# Altium schematic symbol library MCU_Microchip_ATmega.SchLib: 440 symbols (part 6 of 9) (continued)
## ATmega3250PA-A (continued)

## ATmega3250PV-10A
designator *  value ATmega3250PV-10A
ki_keywords: AVR 8bit Microcontroller MegaAVR; ki_description: 10MHz, 32kB Flash, 2kB SRAM, 1kB EEPROM, JTAG, TQFP-100; ki_fp_filters: TQFP*14x14mm*P0.5mm*; Footprint: Package_QFP:TQFP-100_14x14mm_P0.5mm; Supplier: http://ww1.microchip.com/downloads/en/DeviceDoc/doc8023.pdf
footprint TQFP-100_14x14mm_P0.5mm
pins: 1 NC (in) hidden, 2 PE0 (io), 3 PE1 (io), 4 PE2 (io), 5 PE3 (io), 6 PE4 (io), 7 PE5 (io), 8 PE6 (io), 9 PE7 (io), 10 VCC (power), 11 GND (power), 12 NC (in) hidden, 13 PJ0 (io), 14 PJ1 (io), 15 NC (in) hidden, 16 NC (in) hidden, 17 NC (in) hidden, 18 NC (in) hidden, 19 PB0 (io), 20 PB1 (io), 21 PB2 (io), 22 PB3 (io), 23 PB4 (io), 24 PB5 (io), 25 PB6 (io), 26 PB7 (io), 27 NC (in) hidden, 28 PG3 (io), 29 PG4 (io), 30 PG5/~{{RESET}} (io), 31 VCC hidden, 32 GND hidden, 33 XTAL2 (out), 34 XTAL1 (in), 35 NC (in) hidden, 36 NC (in) hidden, 37 PJ2 (io), 38 PJ3 (io), 39 PJ4 (io), 40 PJ5 (io), 41 PJ6 (io), 42 NC (in) hidden, 43 PD0 (io), 44 PD1 (io), 45 PD2 (io), 46 PD3 (io), 47 PD4 (io), 48 PD5 (io), 49 PD6 (io), 50 PD7 (io), 51 PG0 (io), 52 PG1 (io), 53 PC0 (io), 54 PC1 (io), 55 PC2 (io), 56 PC3 (io), 57 PC4 (io), 58 PC5 (io), 59 NC (in) hidden, 60 NC (in) hidden, 61 NC (in) hidden, 62 NC (in) hidden, 63 PH0 (io), 64 PH1 (io), 65 PH2 (io), 66 PH3 (io), 67 NC (in) hidden, 68 PC6 (io), 69 PC7 (io), 70 PG2 (io), 71 PA7 (io), 72 PA6 (io), 73 PA5 (io), 74 PA4 (io), 75 PA3 (io), 76 PA2 (io), 77 PA1 (io), 78 PA0 (io), 79 NC (in) hidden, 80 VCC hidden, 81 GND hidden, 82 NC (in) hidden, 83 NC (in) hidden, 84 PH4 (io), 85 PH5 (io), 86 PH6 (io), 87 PH7 (io), 88 NC (in) hidden, 89 NC (in) hidden, 90 PF7 (io), 91 PF6 (io), 92 PF5 (io), 93 PF4 (io), 94 PF3 (io), 95 PF2 (io), 96 PF1 (io), 97 PF0 (io), 98 AREF, 99 AGND (power), 100 AVCC (power)

## ATmega3250V-8A
designator *  value ATmega3250V-8A
ki_keywords: AVR 8bit Microcontroller MegaAVR; ki_description: 8MHz, 32kB Flash, 2kB SRAM, 1kB EEPROM, JTAG, TQFP-100; ki_fp_filters: TQFP*14x14mm*P0.5mm*; Footprint: Package_QFP:TQFP-100_14x14mm_P0.5mm; Supplier: http://ww1.microchip.com/downloads/en/DeviceDoc/doc2570.pdf
footprint TQFP-100_14x14mm_P0.5mm
pins: 1 NC (in) hidden, 2 PE0 (io), 3 PE1 (io), 4 PE2 (io), 5 PE3 (io), 6 PE4 (io), 7 PE5 (io), 8 PE6 (io), 9 PE7 (io), 10 VCC (power), 11 GND (power), 12 NC (in) hidden, 13 PJ0 (io), 14 PJ1 (io), 15 NC (in) hidden, 16 NC (in) hidden, 17 NC (in) hidden, 18 NC (in) hidden, 19 PB0 (io), 20 PB1 (io), 21 PB2 (io), 22 PB3 (io), 23 PB4 (io), 24 PB5 (io), 25 PB6 (io), 26 PB7 (io), 27 NC (in) hidden, 28 PG3 (io), 29 PG4 (io), 30 PG5/~{{RESET}} (io), 31 VCC hidden, 32 GND hidden, 33 XTAL2 (out), 34 XTAL1 (in), 35 NC (in) hidden, 36 NC (in) hidden, 37 PJ2 (io), 38 PJ3 (io), 39 PJ4 (io), 40 PJ5 (io), 41 PJ6 (io), 42 NC (in) hidden, 43 PD0 (io), 44 PD1 (io), 45 PD2 (io), 46 PD3 (io), 47 PD4 (io), 48 PD5 (io), 49 PD6 (io), 50 PD7 (io), 51 PG0 (io), 52 PG1 (io), 53 PC0 (io), 54 PC1 (io), 55 PC2 (io), 56 PC3 (io), 57 PC4 (io), 58 PC5 (io), 59 NC (in) hidden, 60 NC (in) hidden, 61 NC (in) hidden, 62 NC (in) hidden, 63 PH0 (io), 64 PH1 (io), 65 PH2 (io), 66 PH3 (io), 67 NC (in) hidden, 68 PC6 (io), 69 PC7 (io), 70 PG2 (io), 71 PA7 (io), 72 PA6 (io), 73 PA5 (io), 74 PA4 (io), 75 PA3 (io), 76 PA2 (io), 77 PA1 (io), 78 PA0 (io), 79 NC (in) hidden, 80 VCC hidden, 81 GND hidden, 82 NC (in) hidden, 83 NC (in) hidden, 84 PH4 (io), 85 PH5 (io), 86 PH6 (io), 87 PH7 (io), 88 NC (in) hidden, 89 NC (in) hidden, 90 PF7 (io), 91 PF6 (io), 92 PF5 (io), 93 PF4 (io), 94 PF3 (io), 95 PF2 (io), 96 PF1 (io), 97 PF0 (io), 98 AREF, 99 AGND (power), 100 AVCC (power)

## ATmega3290-16A
designator *  value ATmega3290-16A
ki_keywords: AVR 8bit Microcontroller MegaAVR; ki_description: 16MHz, 32kB Flash, 2kB SRAM, 1kB EEPROM, JTAG, TQFP-100; ki_fp_filters: TQFP*14x14mm*P0.5mm*; Footprint: Package_QFP:TQFP-100_14x14mm_P0.5mm; Supplier: http://ww1.microchip.com/downloads/en/DeviceDoc/doc2552.pdf
footprint TQFP-100_14x14mm_P0.5mm
pins: 1 LCDCAP, 2 PE0 (io), 3 PE1 (io), 4 PE2 (io), 5 PE3 (io), 6 PE4 (io), 7 PE5 (io), 8 PE6 (io), 9 PE7 (io), 10 VCC (power), 11 GND (power), 12 NC (in) hidden, 13 PJ0 (io), 14 PJ1 (io), 15 NC (in) hidden, 16 NC (in) hidden, 17 NC (in) hidden, 18 NC (in) hidden, 19 PB0 (io), 20 PB1 (io), 21 PB2 (io), 22 PB3 (io), 23 PB4 (io), 24 PB5 (io), 25 PB6 (io), 26 PB7 (io), 27 NC (in) hidden, 28 PG3 (io), 29 PG4 (io), 30 PG5/~{{RESET}} (io), 31 VCC hidden, 32 GND hidden, 33 XTAL2 (out), 34 XTAL1 (in), 35 NC (in) hidden, 36 NC (in) hidden, 37 PJ2 (io), 38 PJ3 (io), 39 PJ4 (io), 40 PJ5 (io), 41 PJ6 (io), 42 NC (in) hidden, 43 PD0 (io), 44 PD1 (io), 45 PD2 (io), 46 PD3 (io), 47 PD4 (io), 48 PD5 (io), 49 PD6 (io), 50 PD7 (io), 51 PG0 (io), 52 PG1 (io), 53 PC0 (io), 54 PC1 (io), 55 PC2 (io), 56 PC3 (io), 57 PC4 (io), 58 PC5 (io), 59 NC (in) hidden, 60 NC (in) hidden, 61 NC (in) hidden, 62 NC (in) hidden, 63 PH0 (io), 64 PH1 (io), 65 PH2 (io), 66 PH3 (io), 67 NC (in) hidden, 68 PC6 (io), 69 PC7 (io), 70 PG2 (io), 71 PA7 (io), 72 PA6 (io), 73 PA5 (io), 74 PA4 (io), 75 PA3 (io), 76 PA2 (io), 77 PA1 (io), 78 PA0 (io), 79 NC (in) hidden, 80 VCC hidden, 81 GND hidden, 82 NC (in) hidden, 83 NC (in) hidden, 84 PH4 (io), 85 PH5 (io), 86 PH6 (io), 87 PH7 (io), 88 NC (in) hidden, 89 NC (in) hidden, 90 PF7 (io), 91 PF6 (io), 92 PF5 (io), 93 PF4 (io), 94 PF3 (io), 95 PF2 (io), 96 PF1 (io), 97 PF0 (io), 98 AREF, 99 AGND (power), 100 AVCC (power)

## ATmega3290A-A
designator *  value ATmega3290A-A
ki_keywords: AVR 8bit Microcontroller MegaAVR; ki_description: 20MHz, 32kB Flash, 2kB SRAM, 1kB EEPROM, JTAG, TQFP-100; ki_fp_filters: TQFP*14x14mm*P0.5mm*; Footprint: Package_QFP:TQFP-100_14x14mm_P0.5mm; Supplier: http://ww1.microchip.com/downloads/en/DeviceDoc/atmel-8284-8-bit-avr-microcontroller-atmega169a_pa_329a_pa_3290a_pa_649a_p_6490a_p_datasheet.pdf
footprint TQFP-100_14x14mm_P0.5mm
pins: 1 LCDCAP, 2 PE0 (io), 3 PE1 (io), 4 PE2 (io), 5 PE3 (io), 6 PE4 (io), 7 PE5 (io), 8 PE6 (io), 9 PE7 (io), 10 VCC (power), 11 GND (power), 12 NC (in) hidden, 13 PJ0 (io), 14 PJ1 (io), 15 NC (in) hidden, 16 NC (in) hidden, 17 NC (in) hidden, 18 NC (in) hidden, 19 PB0 (io), 20 PB1 (io), 21 PB2 (io), 22 PB3 (io), 23 PB4 (io), 24 PB5 (io), 25 PB6 (io), 26 PB7 (io), 27 NC (in) hidden, 28 PG3 (io), 29 PG4 (io), 30 PG5/~{{RESET}} (io), 31 VCC hidden, 32 GND hidden, 33 XTAL2 (out), 34 XTAL1 (in), 35 NC (in) hidden, 36 NC (in) hidden, 37 PJ2 (io), 38 PJ3 (io), 39 PJ4 (io), 40 PJ5 (io), 41 PJ6 (io), 42 NC (in) hidden, 43 PD0 (io), 44 PD1 (io), 45 PD2 (io), 46 PD3 (io), 47 PD4 (io), 48 PD5 (io), 49 PD6 (io), 50 PD7 (io), 51 PG0 (io), 52 PG1 (io), 53 PC0 (io), 54 PC1 (io), 55 PC2 (io), 56 PC3 (io), 57 PC4 (io), 58 PC5 (io), 59 NC (in) hidden, 60 NC (in) hidden, 61 NC (in) hidden, 62 NC (in) hidden, 63 PH0 (io), 64 PH1 (io), 65 PH2 (io), 66 PH3 (io), 67 NC (in) hidden, 68 PC6 (io), 69 PC7 (io), 70 PG2 (io), 71 PA7 (io), 72 PA6 (io), 73 PA5 (io), 74 PA4 (io), 75 PA3 (io), 76 PA2 (io), 77 PA1 (io), 78 PA0 (io), 79 NC (in) hidden, 80 VCC hidden, 81 GND hidden, 82 NC (in) hidden, 83 NC (in) hidden, 84 PH4 (io), 85 PH5 (io), 86 PH6 (io), 87 PH7 (io), 88 NC (in) hidden, 89 NC (in) hidden, 90 PF7 (io), 91 PF6 (io), 92 PF5 (io), 93 PF4 (io), 94 PF3 (io), 95 PF2 (io), 96 PF1 (io), 97 PF0 (io), 98 AREF, 99 AGND (power), 100 AVCC (power)

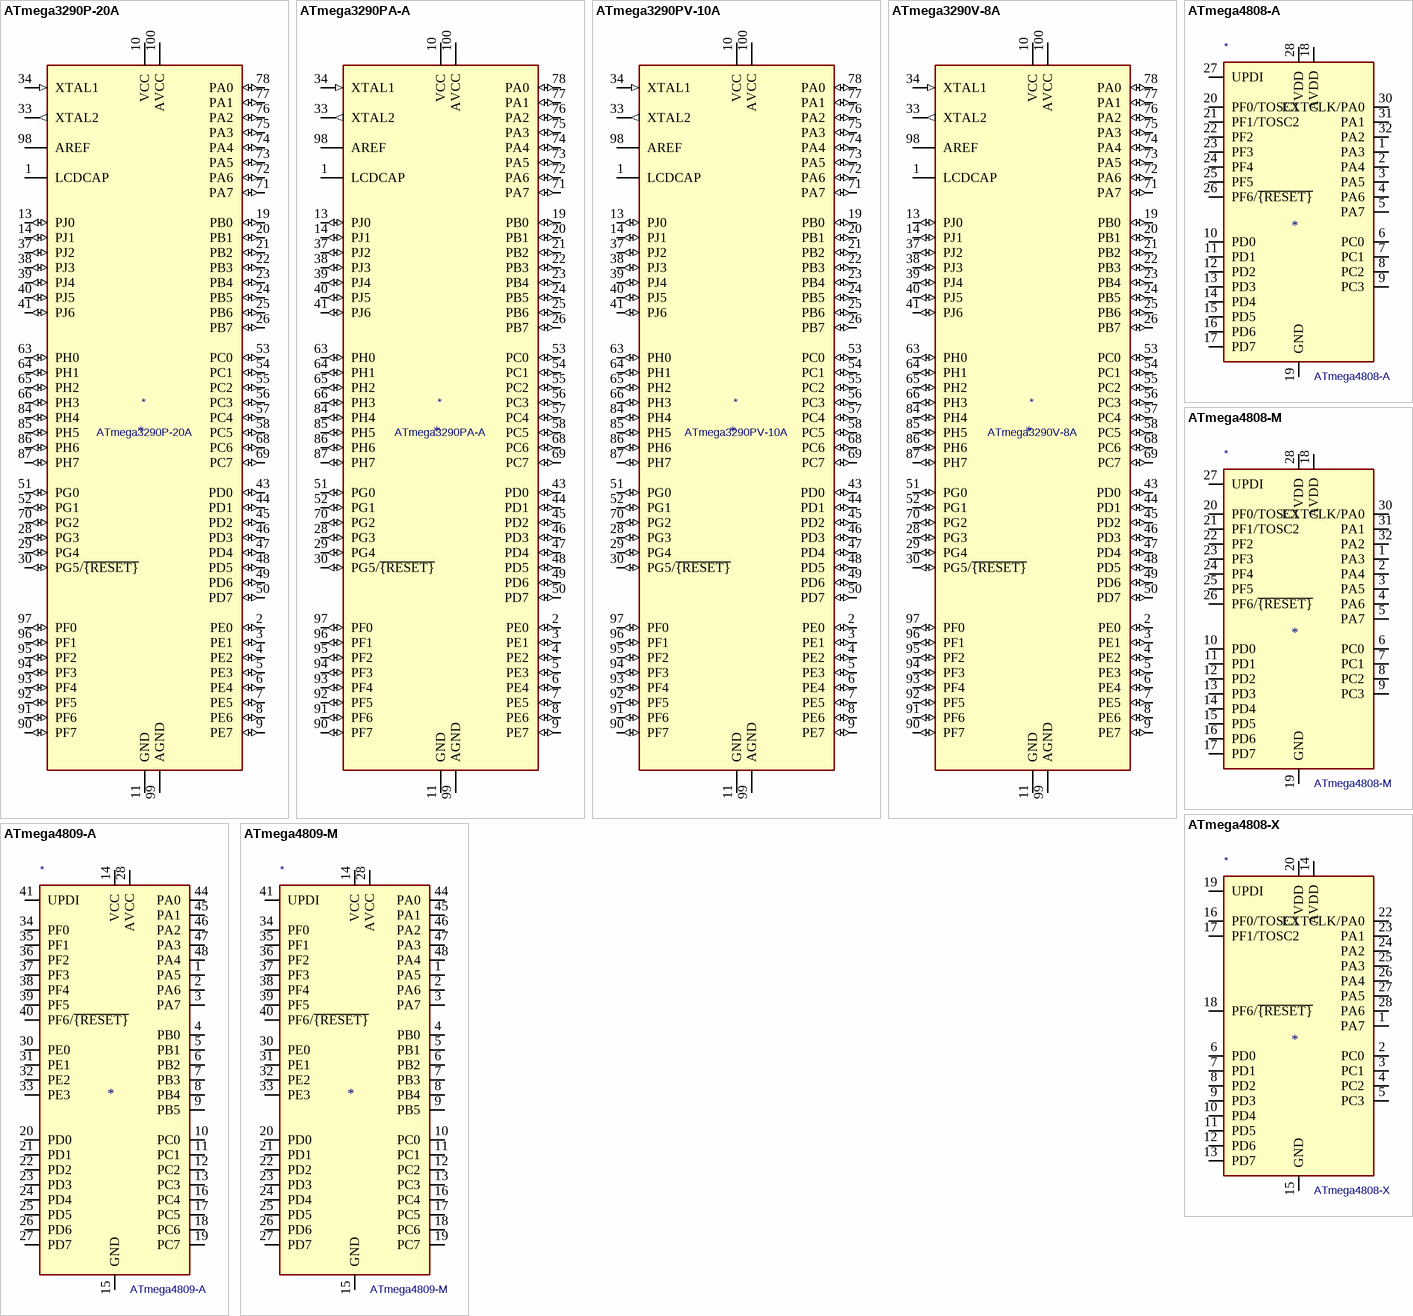
[diagram p27: symbols ATmega3290P-20A to ATmega4809-M]

## ATmega3290P-20A
designator *  value ATmega3290P-20A
ki_keywords: AVR 8bit Microcontroller MegaAVR; ki_description: 20MHz, 32kB Flash, 2kB SRAM, 1kB EEPROM, JTAG, TQFP-100; ki_fp_filters: TQFP*14x14mm*P0.5mm*; Footprint: Package_QFP:TQFP-100_14x14mm_P0.5mm; Supplier: http://ww1.microchip.com/downloads/en/DeviceDoc/Atmel-8021-AVR-ATmega329P-3290P_Datasheet.pdf
footprint TQFP-100_14x14mm_P0.5mm
pins: 1 LCDCAP, 2 PE0 (io), 3 PE1 (io), 4 PE2 (io), 5 PE3 (io), 6 PE4 (io), 7 PE5 (io), 8 PE6 (io), 9 PE7 (io), 10 VCC (power), 11 GND (power), 12 NC (in) hidden, 13 PJ0 (io), 14 PJ1 (io), 15 NC (in) hidden, 16 NC (in) hidden, 17 NC (in) hidden, 18 NC (in) hidden, 19 PB0 (io), 20 PB1 (io), 21 PB2 (io), 22 PB3 (io), 23 PB4 (io), 24 PB5 (io), 25 PB6 (io), 26 PB7 (io), 27 NC (in) hidden, 28 PG3 (io), 29 PG4 (io), 30 PG5/~{{RESET}} (io), 31 VCC hidden, 32 GND hidden, 33 XTAL2 (out), 34 XTAL1 (in), 35 NC (in) hidden, 36 NC (in) hidden, 37 PJ2 (io), 38 PJ3 (io), 39 PJ4 (io), 40 PJ5 (io), 41 PJ6 (io), 42 NC (in) hidden, 43 PD0 (io), 44 PD1 (io), 45 PD2 (io), 46 PD3 (io), 47 PD4 (io), 48 PD5 (io), 49 PD6 (io), 50 PD7 (io), 51 PG0 (io), 52 PG1 (io), 53 PC0 (io), 54 PC1 (io), 55 PC2 (io), 56 PC3 (io), 57 PC4 (io), 58 PC5 (io), 59 NC (in) hidden, 60 NC (in) hidden, 61 NC (in) hidden, 62 NC (in) hidden, 63 PH0 (io), 64 PH1 (io), 65 PH2 (io), 66 PH3 (io), 67 NC (in) hidden, 68 PC6 (io), 69 PC7 (io), 70 PG2 (io), 71 PA7 (io), 72 PA6 (io), 73 PA5 (io), 74 PA4 (io), 75 PA3 (io), 76 PA2 (io), 77 PA1 (io), 78 PA0 (io), 79 NC (in) hidden, 80 VCC hidden, 81 GND hidden, 82 NC (in) hidden, 83 NC (in) hidden, 84 PH4 (io), 85 PH5 (io), 86 PH6 (io), 87 PH7 (io), 88 NC (in) hidden, 89 NC (in) hidden, 90 PF7 (io), 91 PF6 (io), 92 PF5 (io), 93 PF4 (io), 94 PF3 (io), 95 PF2 (io), 96 PF1 (io), 97 PF0 (io), 98 AREF, 99 AGND (power), 100 AVCC (power)

## ATmega3290PA-A
designator *  value ATmega3290PA-A
ki_keywords: AVR 8bit Microcontroller MegaAVR; ki_description: 20MHz, 32kB Flash, 2kB SRAM, 1kB EEPROM, JTAG, TQFP-100; ki_fp_filters: TQFP*14x14mm*P0.5mm*; Footprint: Package_QFP:TQFP-100_14x14mm_P0.5mm; Supplier: http://ww1.microchip.com/downloads/en/DeviceDoc/atmel-8284-8-bit-avr-microcontroller-atmega169a_pa_329a_pa_3290a_pa_649a_p_6490a_p_datasheet.pdf
footprint TQFP-100_14x14mm_P0.5mm
pins: 1 LCDCAP, 2 PE0 (io), 3 PE1 (io), 4 PE2 (io), 5 PE3 (io), 6 PE4 (io), 7 PE5 (io), 8 PE6 (io), 9 PE7 (io), 10 VCC (power), 11 GND (power), 12 NC (in) hidden, 13 PJ0 (io), 14 PJ1 (io), 15 NC (in) hidden, 16 NC (in) hidden, 17 NC (in) hidden, 18 NC (in) hidden, 19 PB0 (io), 20 PB1 (io), 21 PB2 (io), 22 PB3 (io), 23 PB4 (io), 24 PB5 (io), 25 PB6 (io), 26 PB7 (io), 27 NC (in) hidden, 28 PG3 (io), 29 PG4 (io), 30 PG5/~{{RESET}} (io), 31 VCC hidden, 32 GND hidden, 33 XTAL2 (out), 34 XTAL1 (in), 35 NC (in) hidden, 36 NC (in) hidden, 37 PJ2 (io), 38 PJ3 (io), 39 PJ4 (io), 40 PJ5 (io), 41 PJ6 (io), 42 NC (in) hidden, 43 PD0 (io), 44 PD1 (io), 45 PD2 (io), 46 PD3 (io), 47 PD4 (io), 48 PD5 (io), 49 PD6 (io), 50 PD7 (io), 51 PG0 (io), 52 PG1 (io), 53 PC0 (io), 54 PC1 (io), 55 PC2 (io), 56 PC3 (io), 57 PC4 (io), 58 PC5 (io), 59 NC (in) hidden, 60 NC (in) hidden, 61 NC (in) hidden, 62 NC (in) hidden, 63 PH0 (io), 64 PH1 (io), 65 PH2 (io), 66 PH3 (io), 67 NC (in) hidden, 68 PC6 (io), 69 PC7 (io), 70 PG2 (io), 71 PA7 (io), 72 PA6 (io), 73 PA5 (io), 74 PA4 (io), 75 PA3 (io), 76 PA2 (io), 77 PA1 (io), 78 PA0 (io), 79 NC (in) hidden, 80 VCC hidden, 81 GND hidden, 82 NC (in) hidden, 83 NC (in) hidden, 84 PH4 (io), 85 PH5 (io), 86 PH6 (io), 87 PH7 (io), 88 NC (in) hidden, 89 NC (in) hidden, 90 PF7 (io), 91 PF6 (io), 92 PF5 (io), 93 PF4 (io), 94 PF3 (io), 95 PF2 (io), 96 PF1 (io), 97 PF0 (io), 98 AREF, 99 AGND (power), 100 AVCC (power)

## ATmega3290PV-10A
designator *  value ATmega3290PV-10A
ki_keywords: AVR 8bit Microcontroller MegaAVR; ki_description: 10MHz, 32kB Flash, 2kB SRAM, 1kB EEPROM, JTAG, TQFP-100; ki_fp_filters: TQFP*14x14mm*P0.5mm*; Footprint: Package_QFP:TQFP-100_14x14mm_P0.5mm; Supplier: http://ww1.microchip.com/downloads/en/DeviceDoc/Atmel-8021-AVR-ATmega329P-3290P_Datasheet.pdf
footprint TQFP-100_14x14mm_P0.5mm
pins: 1 LCDCAP, 2 PE0 (io), 3 PE1 (io), 4 PE2 (io), 5 PE3 (io), 6 PE4 (io), 7 PE5 (io), 8 PE6 (io), 9 PE7 (io), 10 VCC (power), 11 GND (power), 12 NC (in) hidden, 13 PJ0 (io), 14 PJ1 (io), 15 NC (in) hidden, 16 NC (in) hidden, 17 NC (in) hidden, 18 NC (in) hidden, 19 PB0 (io), 20 PB1 (io), 21 PB2 (io), 22 PB3 (io), 23 PB4 (io), 24 PB5 (io), 25 PB6 (io), 26 PB7 (io), 27 NC (in) hidden, 28 PG3 (io), 29 PG4 (io), 30 PG5/~{{RESET}} (io), 31 VCC hidden, 32 GND hidden, 33 XTAL2 (out), 34 XTAL1 (in), 35 NC (in) hidden, 36 NC (in) hidden, 37 PJ2 (io), 38 PJ3 (io), 39 PJ4 (io), 40 PJ5 (io), 41 PJ6 (io), 42 NC (in) hidden, 43 PD0 (io), 44 PD1 (io), 45 PD2 (io), 46 PD3 (io), 47 PD4 (io), 48 PD5 (io), 49 PD6 (io), 50 PD7 (io), 51 PG0 (io), 52 PG1 (io), 53 PC0 (io), 54 PC1 (io), 55 PC2 (io), 56 PC3 (io), 57 PC4 (io), 58 PC5 (io), 59 NC (in) hidden, 60 NC (in) hidden, 61 NC (in) hidden, 62 NC (in) hidden, 63 PH0 (io), 64 PH1 (io), 65 PH2 (io), 66 PH3 (io), 67 NC (in) hidden, 68 PC6 (io), 69 PC7 (io), 70 PG2 (io), 71 PA7 (io), 72 PA6 (io), 73 PA5 (io), 74 PA4 (io), 75 PA3 (io), 76 PA2 (io), 77 PA1 (io), 78 PA0 (io), 79 NC (in) hidden, 80 VCC hidden, 81 GND hidden, 82 NC (in) hidden, 83 NC (in) hidden, 84 PH4 (io), 85 PH5 (io), 86 PH6 (io), 87 PH7 (io), 88 NC (in) hidden, 89 NC (in) hidden, 90 PF7 (io), 91 PF6 (io), 92 PF5 (io), 93 PF4 (io), 94 PF3 (io), 95 PF2 (io), 96 PF1 (io), 97 PF0 (io), 98 AREF, 99 AGND (power), 100 AVCC (power)

## ATmega3290V-8A
designator *  value ATmega3290V-8A
ki_keywords: AVR 8bit Microcontroller MegaAVR; ki_description: 8MHz, 32kB Flash, 2kB SRAM, 1kB EEPROM, JTAG, TQFP-100; ki_fp_filters: TQFP*14x14mm*P0.5mm*; Footprint: Package_QFP:TQFP-100_14x14mm_P0.5mm; Supplier: http://ww1.microchip.com/downloads/en/DeviceDoc/doc2552.pdf
footprint TQFP-100_14x14mm_P0.5mm
pins: 1 LCDCAP, 2 PE0 (io), 3 PE1 (io), 4 PE2 (io), 5 PE3 (io), 6 PE4 (io), 7 PE5 (io), 8 PE6 (io), 9 PE7 (io), 10 VCC (power), 11 GND (power), 12 NC (in) hidden, 13 PJ0 (io), 14 PJ1 (io), 15 NC (in) hidden, 16 NC (in) hidden, 17 NC (in) hidden, 18 NC (in) hidden, 19 PB0 (io), 20 PB1 (io), 21 PB2 (io), 22 PB3 (io), 23 PB4 (io), 24 PB5 (io), 25 PB6 (io), 26 PB7 (io), 27 NC (in) hidden, 28 PG3 (io), 29 PG4 (io), 30 PG5/~{{RESET}} (io), 31 VCC hidden, 32 GND hidden, 33 XTAL2 (out), 34 XTAL1 (in), 35 NC (in) hidden, 36 NC (in) hidden, 37 PJ2 (io), 38 PJ3 (io), 39 PJ4 (io), 40 PJ5 (io), 41 PJ6 (io), 42 NC (in) hidden, 43 PD0 (io), 44 PD1 (io), 45 PD2 (io), 46 PD3 (io), 47 PD4 (io), 48 PD5 (io), 49 PD6 (io), 50 PD7 (io), 51 PG0 (io), 52 PG1 (io), 53 PC0 (io), 54 PC1 (io), 55 PC2 (io), 56 PC3 (io), 57 PC4 (io), 58 PC5 (io), 59 NC (in) hidden, 60 NC (in) hidden, 61 NC (in) hidden, 62 NC (in) hidden, 63 PH0 (io), 64 PH1 (io), 65 PH2 (io), 66 PH3 (io), 67 NC (in) hidden, 68 PC6 (io), 69 PC7 (io), 70 PG2 (io), 71 PA7 (io), 72 PA6 (io), 73 PA5 (io), 74 PA4 (io), 75 PA3 (io), 76 PA2 (io), 77 PA1 (io), 78 PA0 (io), 79 NC (in) hidden, 80 VCC hidden, 81 GND hidden, 82 NC (in) hidden, 83 NC (in) hidden, 84 PH4 (io), 85 PH5 (io), 86 PH6 (io), 87 PH7 (io), 88 NC (in) hidden, 89 NC (in) hidden, 90 PF7 (io), 91 PF6 (io), 92 PF5 (io), 93 PF4 (io), 94 PF3 (io), 95 PF2 (io), 96 PF1 (io), 97 PF0 (io), 98 AREF, 99 AGND (power), 100 AVCC (power)

## ATmega4808-A
designator *  value ATmega4808-A
ki_keywords: AVR 8bit Microcontroller MegaAVR; ki_description: 20MHz, 48kB Flash, 6kB SRAM, 256B EEPROM, TQFP-32; ki_fp_filters: TQFP*7x7mm*P0.8mm*; Footprint: Package_QFP:TQFP-32_7x7mm_P0.8mm; Supplier: http://ww1.microchip.com/downloads/en/DeviceDoc/40002017A.pdf
footprint TQFP-32_7x7mm_P0.8mm
pins: 1 PA3 (io), 2 PA4 (io), 3 PA5 (io), 4 PA6 (io), 5 PA7 (io), 6 PC0 (io), 7 PC1 (io), 8 PC2 (io), 9 PC3 (io), 10 PD0 (io), 11 PD1 (io), 12 PD2 (io), 13 PD3 (io), 14 PD4 (io), 15 PD5 (io), 16 PD6 (io), 17 PD7 (io), 18 AVDD (power), 19 GND (power), 20 PF0/TOSC1 (io), 21 PF1/TOSC2 (io), 22 PF2 (io), 23 PF3 (io), 24 PF4 (io), 25 PF5 (io), 26 PF6/~{{RESET}} (io), 27 UPDI (io), 28 VDD (power), 29 GND hidden, 30 EXTCLK/PA0 (io), 31 PA1 (io), 32 PA2 (io)

## ATmega4808-M
designator *  value ATmega4808-M
ki_keywords: AVR 8bit Microcontroller MegaAVR; ki_description: 20MHz, 48kB Flash, 6kB SRAM, 256B EEPROM, VQFN-32; ki_fp_filters: QFN*1EP*5x5mm*P0.5mm*; Footprint: Package_DFN_QFN:QFN-32-1EP_5x5mm_P0.5mm_EP3.1x3.1mm_ThermalVias; Supplier: http://ww1.microchip.com/downloads/en/DeviceDoc/40002017A.pdf
footprint QFN-32-1EP_5x5mm_P0.5mm_EP3.1x3.1mm_ThermalVias
pins: 1 PA3 (io), 2 PA4 (io), 3 PA5 (io), 4 PA6 (io), 5 PA7 (io), 6 PC0 (io), 7 PC1 (io), 8 PC2 (io), 9 PC3 (io), 10 PD0 (io), 11 PD1 (io), 12 PD2 (io), 13 PD3 (io), 14 PD4 (io), 15 PD5 (io), 16 PD6 (io), 17 PD7 (io), 18 AVDD (power), 19 GND (power), 20 PF0/TOSC1 (io), 21 PF1/TOSC2 (io), 22 PF2 (io), 23 PF3 (io), 24 PF4 (io), 25 PF5 (io), 26 PF6/~{{RESET}} (io), 27 UPDI (io), 28 VDD (power), 29 GND hidden, 30 EXTCLK/PA0 (io), 31 PA1 (io), 32 PA2 (io), 33 GND hidden

## ATmega4808-X
designator *  value ATmega4808-X
ki_keywords: AVR 8bit Microcontroller MegaAVR; ki_description: 20MHz, 48kB Flash, 6kB SRAM, 256B EEPROM, SSOP-28; ki_fp_filters: SSOP*5.3x10.2mm*P0.65mm*; Footprint: Package_SO:SSOP-28_5.3x10.2mm_P0.65mm; Supplier: http://ww1.microchip.com/downloads/en/DeviceDoc/40002018A.pdf
footprint SSOP-28_5.3x10.2mm_P0.65mm
pins: 1 PA7 (io), 2 PC0 (io), 3 PC1 (io), 4 PC2 (io), 5 PC3 (io), 6 PD0 (io), 7 PD1 (io), 8 PD2 (io), 9 PD3 (io), 10 PD4 (io), 11 PD5 (io), 12 PD6 (io), 13 PD7 (io), 14 AVDD (power), 15 GND (power), 16 PF0/TOSC1 (io), 17 PF1/TOSC2 (io), 18 PF6/~{{RESET}} (io), 19 UPDI (io), 20 VDD (power), 21 GND hidden, 22 EXTCLK/PA0 (io), 23 PA1 (io), 24 PA2 (io), 25 PA3 (io), 26 PA4 (io), 27 PA5 (io), 28 PA6 (io)

## ATmega4809-A
designator *  value ATmega4809-A
ki_keywords: AVR 8bit Microcontroller MegaAVR; ki_description: 20MHz, 48kB Flash, 6kB SRAM, 256B EEPROM, TQFP-48; ki_fp_filters: TQFP*7x7mm*P0.5mm*; Footprint: Package_QFP:TQFP-48_7x7mm_P0.5mm; Supplier: http://ww1.microchip.com/downloads/en/DeviceDoc/40002016A.pdf
footprint TQFP-48_7x7mm_P0.5mm
pins: 1 PA5 (io), 2 PA6 (io), 3 PA7 (io), 4 PB0 (io), 5 PB1 (io), 6 PB2 (io), 7 PB3 (io), 8 PB4 (io), 9 PB5 (io), 10 PC0 (io), 11 PC1 (io), 12 PC2 (io), 13 PC3 (io), 14 VCC (power), 15 GND (power), 16 PC4 (io), 17 PC5 (io), 18 PC6 (io), 19 PC7 (io), 20 PD0 (io), 21 PD1 (io), 22 PD2 (io), 23 PD3 (io), 24 PD4 (io), 25 PD5 (io), 26 PD6 (io), 27 PD7 (io), 28 AVCC (power), 29 GND hidden, 30 PE0 (io), 31 PE1 (io), 32 PE2 (io), 33 PE3 (io), 34 PF0 (io), 35 PF1 (io), 36 PF2 (io), 37 PF3 (io), 38 PF4 (io), 39 PF5 (io), 40 PF6/~{{RESET}} (io), 41 UPDI (io), 42 VCC hidden, 43 GND hidden, 44 PA0 (io), 45 PA1 (io), 46 PA2 (io), 47 PA3 (io), 48 PA4 (io)

## ATmega4809-M
designator *  value ATmega4809-M
ki_keywords: AVR 8bit Microcontroller MegaAVR; ki_description: 20MHz, 48kB Flash, 6kB SRAM, 256B EEPROM, UQFN-48; ki_fp_filters: UQFN*1EP*6x6mm*P0.4mm*; Footprint: Package_DFN_QFN:UQFN-48-1EP_6x6mm_P0.4mm_EP4.62x4.62mm; Supplier: http://ww1.microchip.com/downloads/en/DeviceDoc/40002016A.pdf
footprint UQFN-48-1EP_6x6mm_P0.4mm_EP4.62x4.62mm
pins: 1 PA5 (io), 2 PA6 (io), 3 PA7 (io), 4 PB0 (io), 5 PB1 (io), 6 PB2 (io), 7 PB3 (io), 8 PB4 (io), 9 PB5 (io), 10 PC0 (io), 11 PC1 (io), 12 PC2 (io), 13 PC3 (io), 14 VCC (power), 15 GND (power), 16 PC4 (io), 17 PC5 (io), 18 PC6 (io), 19 PC7 (io), 20 PD0 (io), 21 PD1 (io), 22 PD2 (io), 23 PD3 (io), 24 PD4 (io), 25 PD5 (io), 26 PD6 (io), 27 PD7 (io), 28 AVCC (power), 29 GND hidden, 30 PE0 (io), 31 PE1 (io), 32 PE2 (io), 33 PE3 (io), 34 PF0 (io), 35 PF1 (io), 36 PF2 (io), 37 PF3 (io), 38 PF4 (io), 39 PF5 (io), 40 PF6/~{{RESET}} (io), 41 UPDI (io), 42 VCC hidden, 43 GND hidden, 44 PA0 (io), 45 PA1 (io), 46 PA2 (io), 47 PA3 (io), 48 PA4 (io), 49 GND hidden

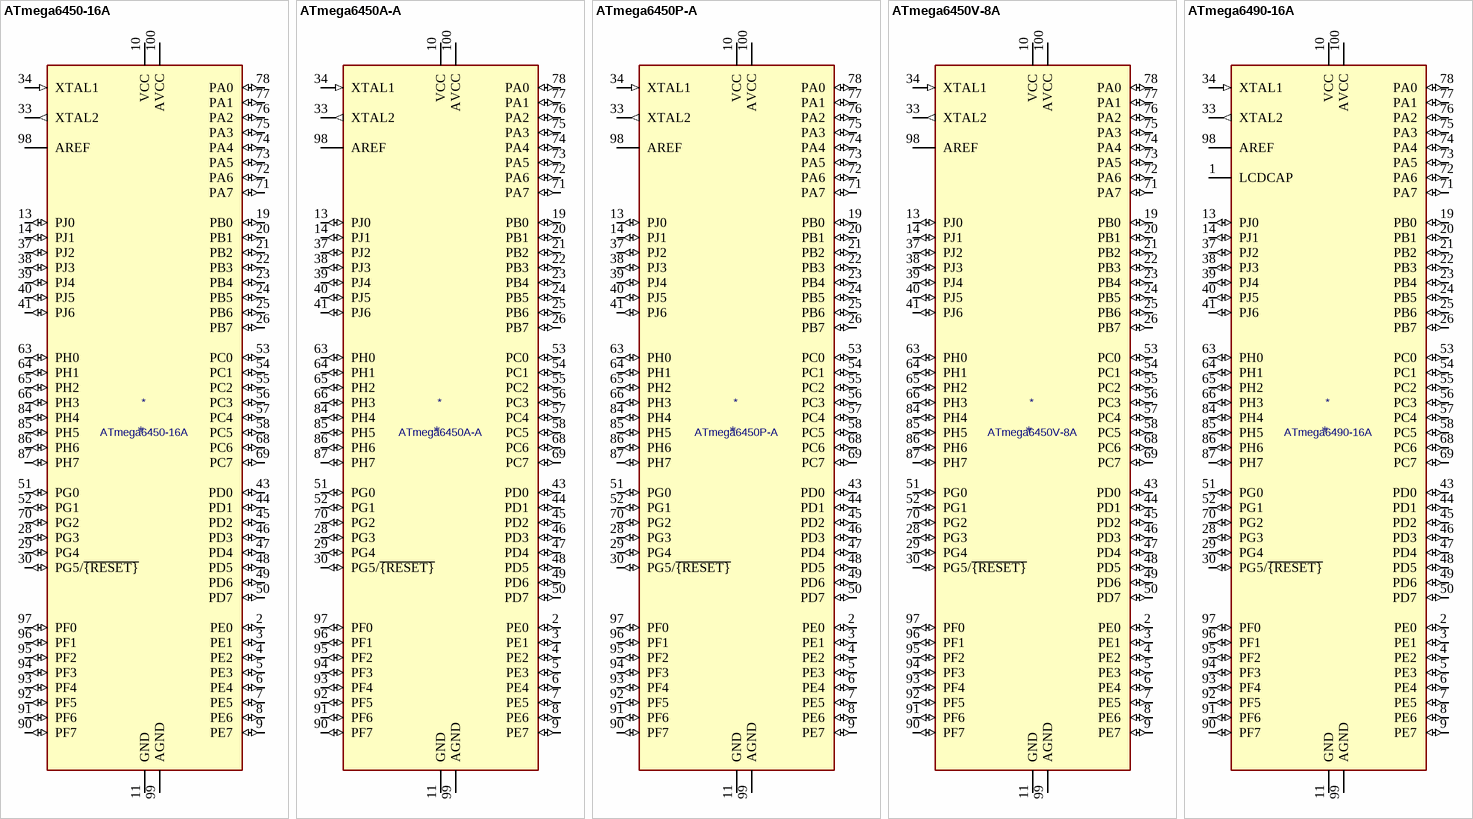
[diagram p28: symbols ATmega6450-16A to ATmega6490-16A]

## ATmega6450-16A
designator *  value ATmega6450-16A
ki_keywords: AVR 8bit Microcontroller MegaAVR; ki_description: 16MHz, 64kB Flash, 4kB SRAM, 2kB EEPROM, JTAG, TQFP-100; ki_fp_filters: TQFP*14x14mm*P0.5mm*; Footprint: Package_QFP:TQFP-100_14x14mm_P0.5mm; Supplier: http://ww1.microchip.com/downloads/en/DeviceDoc/doc2570.pdf
footprint TQFP-100_14x14mm_P0.5mm
pins: 1 NC (in) hidden, 2 PE0 (io), 3 PE1 (io), 4 PE2 (io), 5 PE3 (io), 6 PE4 (io), 7 PE5 (io), 8 PE6 (io), 9 PE7 (io), 10 VCC (power), 11 GND (power), 12 NC (in) hidden, 13 PJ0 (io), 14 PJ1 (io), 15 NC (in) hidden, 16 NC (in) hidden, 17 NC (in) hidden, 18 NC (in) hidden, 19 PB0 (io), 20 PB1 (io), 21 PB2 (io), 22 PB3 (io), 23 PB4 (io), 24 PB5 (io), 25 PB6 (io), 26 PB7 (io), 27 NC (in) hidden, 28 PG3 (io), 29 PG4 (io), 30 PG5/~{{RESET}} (io), 31 VCC hidden, 32 GND hidden, 33 XTAL2 (out), 34 XTAL1 (in), 35 NC (in) hidden, 36 NC (in) hidden, 37 PJ2 (io), 38 PJ3 (io), 39 PJ4 (io), 40 PJ5 (io), 41 PJ6 (io), 42 NC (in) hidden, 43 PD0 (io), 44 PD1 (io), 45 PD2 (io), 46 PD3 (io), 47 PD4 (io), 48 PD5 (io), 49 PD6 (io), 50 PD7 (io), 51 PG0 (io), 52 PG1 (io), 53 PC0 (io), 54 PC1 (io), 55 PC2 (io), 56 PC3 (io), 57 PC4 (io), 58 PC5 (io), 59 NC (in) hidden, 60 NC (in) hidden, 61 NC (in) hidden, 62 NC (in) hidden, 63 PH0 (io), 64 PH1 (io), 65 PH2 (io), 66 PH3 (io), 67 NC (in) hidden, 68 PC6 (io), 69 PC7 (io), 70 PG2 (io), 71 PA7 (io), 72 PA6 (io), 73 PA5 (io), 74 PA4 (io), 75 PA3 (io), 76 PA2 (io), 77 PA1 (io), 78 PA0 (io), 79 NC (in) hidden, 80 VCC hidden, 81 GND hidden, 82 NC (in) hidden, 83 NC (in) hidden, 84 PH4 (io), 85 PH5 (io), 86 PH6 (io), 87 PH7 (io), 88 NC (in) hidden, 89 NC (in) hidden, 90 PF7 (io), 91 PF6 (io), 92 PF5 (io), 93 PF4 (io), 94 PF3 (io), 95 PF2 (io), 96 PF1 (io), 97 PF0 (io), 98 AREF, 99 AGND (power), 100 AVCC (power)

## ATmega6450A-A
designator *  value ATmega6450A-A
ki_keywords: AVR 8bit Microcontroller MegaAVR; ki_description: 20MHz, 64kB Flash, 4kB SRAM, 2kB EEPROM, JTAG, TQFP-100; ki_fp_filters: TQFP*14x14mm*P0.5mm*; Footprint: Package_QFP:TQFP-100_14x14mm_P0.5mm; Supplier: http://ww1.microchip.com/downloads/en/DeviceDoc/atmel-8285-8-bit-avr-microcontroller-atmega165a_pa_325a_pa_3250a_pa_645a_p_6450a_p_datasheet.pdf
footprint TQFP-100_14x14mm_P0.5mm
pins: 1 NC (in) hidden, 2 PE0 (io), 3 PE1 (io), 4 PE2 (io), 5 PE3 (io), 6 PE4 (io), 7 PE5 (io), 8 PE6 (io), 9 PE7 (io), 10 VCC (power), 11 GND (power), 12 NC (in) hidden, 13 PJ0 (io), 14 PJ1 (io), 15 NC (in) hidden, 16 NC (in) hidden, 17 NC (in) hidden, 18 NC (in) hidden, 19 PB0 (io), 20 PB1 (io), 21 PB2 (io), 22 PB3 (io), 23 PB4 (io), 24 PB5 (io), 25 PB6 (io), 26 PB7 (io), 27 NC (in) hidden, 28 PG3 (io), 29 PG4 (io), 30 PG5/~{{RESET}} (io), 31 VCC hidden, 32 GND hidden, 33 XTAL2 (out), 34 XTAL1 (in), 35 NC (in) hidden, 36 NC (in) hidden, 37 PJ2 (io), 38 PJ3 (io), 39 PJ4 (io), 40 PJ5 (io), 41 PJ6 (io), 42 NC (in) hidden, 43 PD0 (io), 44 PD1 (io), 45 PD2 (io), 46 PD3 (io), 47 PD4 (io), 48 PD5 (io), 49 PD6 (io), 50 PD7 (io), 51 PG0 (io), 52 PG1 (io), 53 PC0 (io), 54 PC1 (io), 55 PC2 (io), 56 PC3 (io), 57 PC4 (io), 58 PC5 (io), 59 NC (in) hidden, 60 NC (in) hidden, 61 NC (in) hidden, 62 NC (in) hidden, 63 PH0 (io), 64 PH1 (io), 65 PH2 (io), 66 PH3 (io), 67 NC (in) hidden, 68 PC6 (io), 69 PC7 (io), 70 PG2 (io), 71 PA7 (io), 72 PA6 (io), 73 PA5 (io), 74 PA4 (io), 75 PA3 (io), 76 PA2 (io), 77 PA1 (io), 78 PA0 (io), 79 NC (in) hidden, 80 VCC hidden, 81 GND hidden, 82 NC (in) hidden, 83 NC (in) hidden, 84 PH4 (io), 85 PH5 (io), 86 PH6 (io), 87 PH7 (io), 88 NC (in) hidden, 89 NC (in) hidden, 90 PF7 (io), 91 PF6 (io), 92 PF5 (io), 93 PF4 (io), 94 PF3 (io), 95 PF2 (io), 96 PF1 (io), 97 PF0 (io), 98 AREF, 99 AGND (power), 100 AVCC (power)

## ATmega6450P-A
designator *  value ATmega6450P-A
ki_keywords: AVR 8bit Microcontroller MegaAVR; ki_description: 20MHz, 64kB Flash, 4kB SRAM, 2kB EEPROM, JTAG, TQFP-100; ki_fp_filters: TQFP*14x14mm*P0.5mm*; Footprint: Package_QFP:TQFP-100_14x14mm_P0.5mm; Supplier: http://ww1.microchip.com/downloads/en/DeviceDoc/atmel-8285-8-bit-avr-microcontroller-atmega165a_pa_325a_pa_3250a_pa_645a_p_6450a_p_datasheet.pdf
footprint TQFP-100_14x14mm_P0.5mm
pins: 1 NC (in) hidden, 2 PE0 (io), 3 PE1 (io), 4 PE2 (io), 5 PE3 (io), 6 PE4 (io), 7 PE5 (io), 8 PE6 (io), 9 PE7 (io), 10 VCC (power), 11 GND (power), 12 NC (in) hidden, 13 PJ0 (io), 14 PJ1 (io), 15 NC (in) hidden, 16 NC (in) hidden, 17 NC (in) hidden, 18 NC (in) hidden, 19 PB0 (io), 20 PB1 (io), 21 PB2 (io), 22 PB3 (io), 23 PB4 (io), 24 PB5 (io), 25 PB6 (io), 26 PB7 (io), 27 NC (in) hidden, 28 PG3 (io), 29 PG4 (io), 30 PG5/~{{RESET}} (io), 31 VCC hidden, 32 GND hidden, 33 XTAL2 (out), 34 XTAL1 (in), 35 NC (in) hidden, 36 NC (in) hidden, 37 PJ2 (io), 38 PJ3 (io), 39 PJ4 (io), 40 PJ5 (io), 41 PJ6 (io), 42 NC (in) hidden, 43 PD0 (io), 44 PD1 (io), 45 PD2 (io), 46 PD3 (io), 47 PD4 (io), 48 PD5 (io), 49 PD6 (io), 50 PD7 (io), 51 PG0 (io), 52 PG1 (io), 53 PC0 (io), 54 PC1 (io), 55 PC2 (io), 56 PC3 (io), 57 PC4 (io), 58 PC5 (io), 59 NC (in) hidden, 60 NC (in) hidden, 61 NC (in) hidden, 62 NC (in) hidden, 63 PH0 (io), 64 PH1 (io), 65 PH2 (io), 66 PH3 (io), 67 NC (in) hidden, 68 PC6 (io), 69 PC7 (io), 70 PG2 (io), 71 PA7 (io), 72 PA6 (io), 73 PA5 (io), 74 PA4 (io), 75 PA3 (io), 76 PA2 (io), 77 PA1 (io), 78 PA0 (io), 79 NC (in) hidden, 80 VCC hidden, 81 GND hidden, 82 NC (in) hidden, 83 NC (in) hidden, 84 PH4 (io), 85 PH5 (io), 86 PH6 (io), 87 PH7 (io), 88 NC (in) hidden, 89 NC (in) hidden, 90 PF7 (io), 91 PF6 (io), 92 PF5 (io), 93 PF4 (io), 94 PF3 (io), 95 PF2 (io), 96 PF1 (io), 97 PF0 (io), 98 AREF, 99 AGND (power), 100 AVCC (power)

## ATmega6450V-8A
designator *  value ATmega6450V-8A
ki_keywords: AVR 8bit Microcontroller MegaAVR; ki_description: 8MHz, 64kB Flash, 4kB SRAM, 2kB EEPROM, JTAG, TQFP-100; ki_fp_filters: TQFP*14x14mm*P0.5mm*; Footprint: Package_QFP:TQFP-100_14x14mm_P0.5mm; Supplier: http://ww1.microchip.com/downloads/en/DeviceDoc/doc2570.pdf
footprint TQFP-100_14x14mm_P0.5mm
pins: 1 NC (in) hidden, 2 PE0 (io), 3 PE1 (io), 4 PE2 (io), 5 PE3 (io), 6 PE4 (io), 7 PE5 (io), 8 PE6 (io), 9 PE7 (io), 10 VCC (power), 11 GND (power), 12 NC (in) hidden, 13 PJ0 (io), 14 PJ1 (io), 15 NC (in) hidden, 16 NC (in) hidden, 17 NC (in) hidden, 18 NC (in) hidden, 19 PB0 (io), 20 PB1 (io), 21 PB2 (io), 22 PB3 (io), 23 PB4 (io), 24 PB5 (io), 25 PB6 (io), 26 PB7 (io), 27 NC (in) hidden, 28 PG3 (io), 29 PG4 (io), 30 PG5/~{{RESET}} (io), 31 VCC hidden, 32 GND hidden, 33 XTAL2 (out), 34 XTAL1 (in), 35 NC (in) hidden, 36 NC (in) hidden, 37 PJ2 (io), 38 PJ3 (io), 39 PJ4 (io), 40 PJ5 (io), 41 PJ6 (io), 42 NC (in) hidden, 43 PD0 (io), 44 PD1 (io), 45 PD2 (io), 46 PD3 (io), 47 PD4 (io), 48 PD5 (io), 49 PD6 (io), 50 PD7 (io), 51 PG0 (io), 52 PG1 (io), 53 PC0 (io), 54 PC1 (io), 55 PC2 (io), 56 PC3 (io), 57 PC4 (io), 58 PC5 (io), 59 NC (in) hidden, 60 NC (in) hidden, 61 NC (in) hidden, 62 NC (in) hidden, 63 PH0 (io), 64 PH1 (io), 65 PH2 (io), 66 PH3 (io), 67 NC (in) hidden, 68 PC6 (io), 69 PC7 (io), 70 PG2 (io), 71 PA7 (io), 72 PA6 (io), 73 PA5 (io), 74 PA4 (io), 75 PA3 (io), 76 PA2 (io), 77 PA1 (io), 78 PA0 (io), 79 NC (in) hidden, 80 VCC hidden, 81 GND hidden, 82 NC (in) hidden, 83 NC (in) hidden, 84 PH4 (io), 85 PH5 (io), 86 PH6 (io), 87 PH7 (io), 88 NC (in) hidden, 89 NC (in) hidden, 90 PF7 (io), 91 PF6 (io), 92 PF5 (io), 93 PF4 (io), 94 PF3 (io), 95 PF2 (io), 96 PF1 (io), 97 PF0 (io), 98 AREF, 99 AGND (power), 100 AVCC (power)

## ATmega6490-16A
designator *  value ATmega6490-16A
ki_keywords: AVR 8bit Microcontroller MegaAVR; ki_description: 16MHz, 64kB Flash, 4kB SRAM, 2kB EEPROM, JTAG, TQFP-100; ki_fp_filters: TQFP*14x14mm*P0.5mm*; Footprint: Package_QFP:TQFP-100_14x14mm_P0.5mm; Supplier: http://ww1.microchip.com/downloads/en/DeviceDoc/doc2552.pdf
footprint TQFP-100_14x14mm_P0.5mm
pins: 1 LCDCAP, 2 PE0 (io), 3 PE1 (io), 4 PE2 (io), 5 PE3 (io), 6 PE4 (io), 7 PE5 (io), 8 PE6 (io), 9 PE7 (io), 10 VCC (power), 11 GND (power), 12 NC (in) hidden, 13 PJ0 (io), 14 PJ1 (io), 15 NC (in) hidden, 16 NC (in) hidden, 17 NC (in) hidden, 18 NC (in) hidden, 19 PB0 (io), 20 PB1 (io), 21 PB2 (io), 22 PB3 (io), 23 PB4 (io), 24 PB5 (io), 25 PB6 (io), 26 PB7 (io), 27 NC (in) hidden, 28 PG3 (io), 29 PG4 (io), 30 PG5/~{{RESET}} (io), 31 VCC hidden, 32 GND hidden, 33 XTAL2 (out), 34 XTAL1 (in), 35 NC (in) hidden, 36 NC (in) hidden, 37 PJ2 (io), 38 PJ3 (io), 39 PJ4 (io), 40 PJ5 (io), 41 PJ6 (io), 42 NC (in) hidden, 43 PD0 (io), 44 PD1 (io), 45 PD2 (io), 46 PD3 (io), 47 PD4 (io), 48 PD5 (io), 49 PD6 (io), 50 PD7 (io), 51 PG0 (io), 52 PG1 (io), 53 PC0 (io), 54 PC1 (io), 55 PC2 (io), 56 PC3 (io), 57 PC4 (io), 58 PC5 (io), 59 NC (in) hidden, 60 NC (in) hidden, 61 NC (in) hidden, 62 NC (in) hidden, 63 PH0 (io), 64 PH1 (io), 65 PH2 (io), 66 PH3 (io), 67 NC (in) hidden, 68 PC6 (io), 69 PC7 (io), 70 PG2 (io), 71 PA7 (io), 72 PA6 (io), 73 PA5 (io), 74 PA4 (io), 75 PA3 (io), 76 PA2 (io), 77 PA1 (io), 78 PA0 (io), 79 NC (in) hidden, 80 VCC hidden, 81 GND hidden, 82 NC (in) hidden, 83 NC (in) hidden, 84 PH4 (io), 85 PH5 (io), 86 PH6 (io), 87 PH7 (io), 88 NC (in) hidden, 89 NC (in) hidden, 90 PF7 (io), 91 PF6 (io), 92 PF5 (io), 93 PF4 (io), 94 PF3 (io), 95 PF2 (io), 96 PF1 (io), 97 PF0 (io), 98 AREF, 99 AGND (power), 100 AVCC (power)

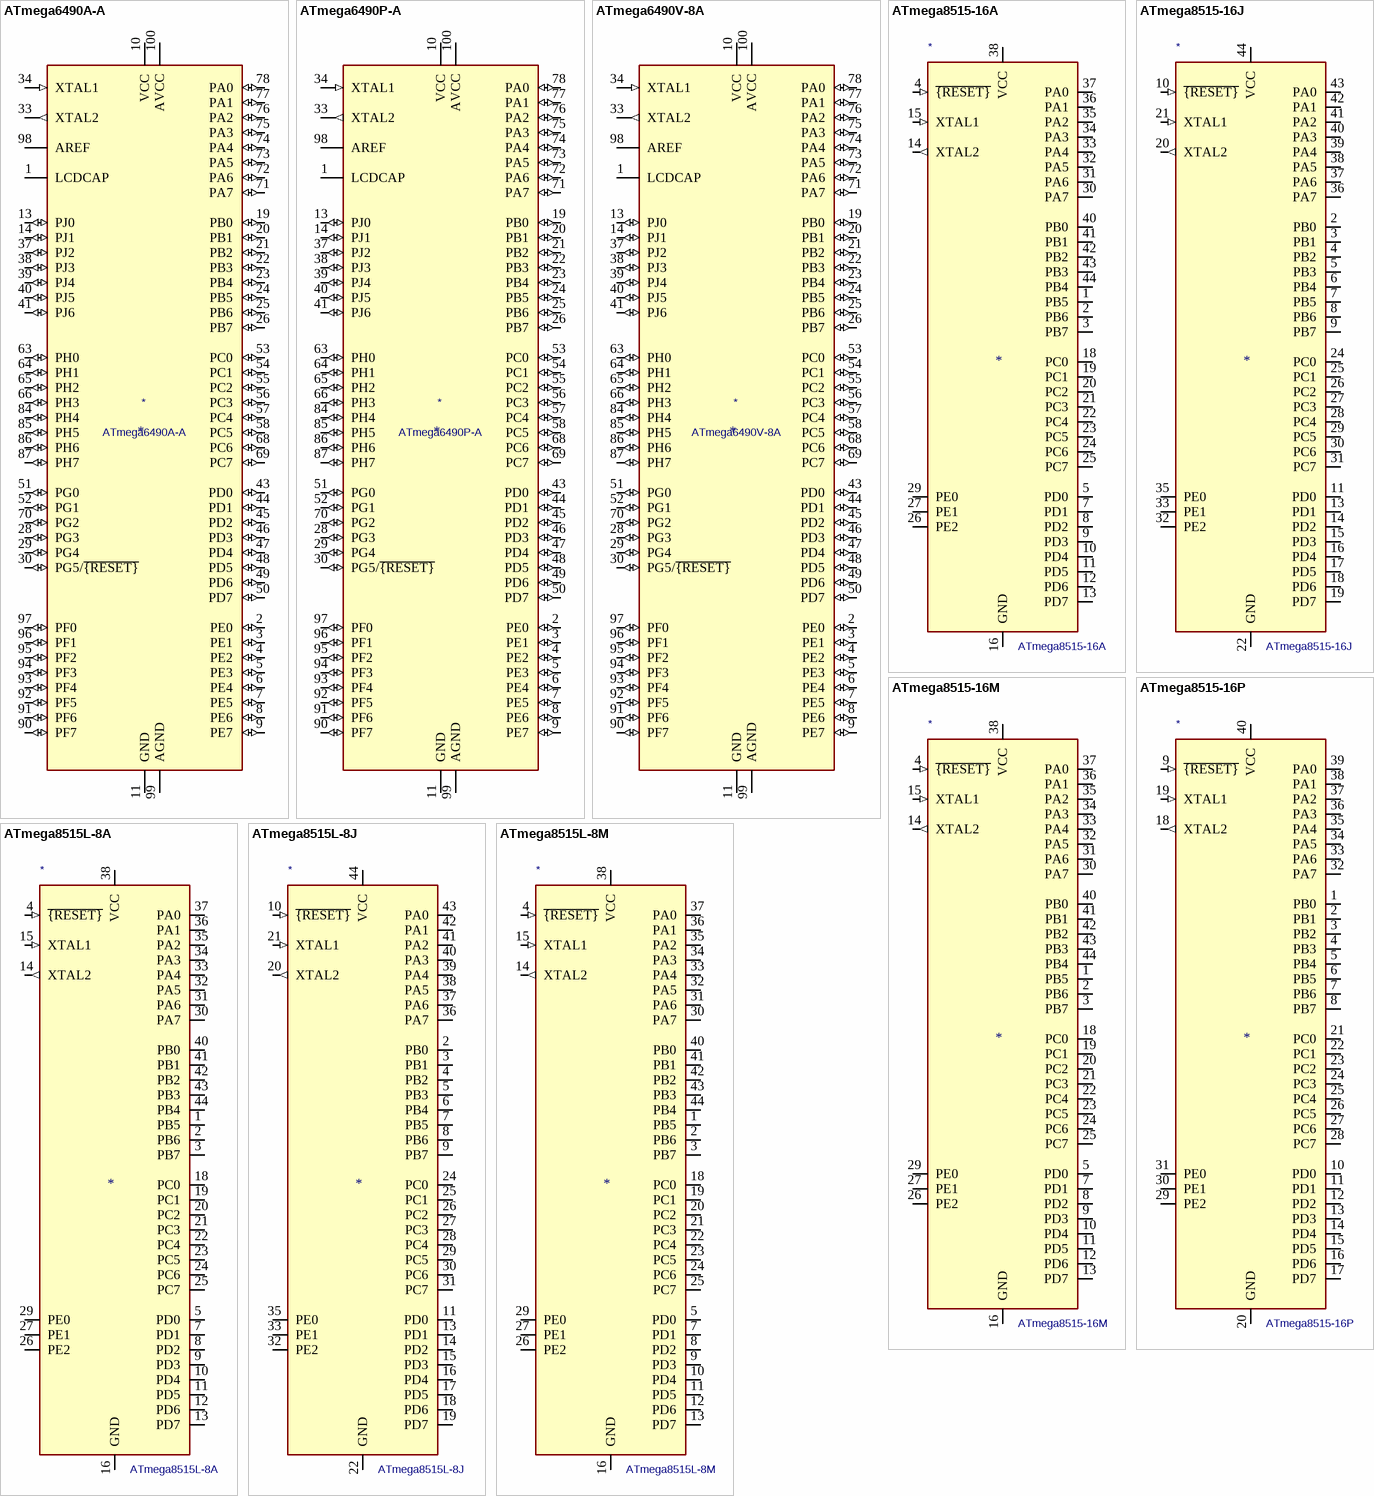
[diagram p29: symbols ATmega6490A-A to ATmega8515L-8M]